# Altium footprint library TomvanRijn-PCB.PcbLib: 165 footprints (part 5 of 11)
Each footprint in its own frame and in the unit in brackets; x right, y up, seen from the top. Pads: shape width x height; smd on the part's side, far side on the other; paste and mask are expansions set on the pad; w line width, h text height; cw(c..) or ccw(c..) is an arc to the next point about the centre after c.
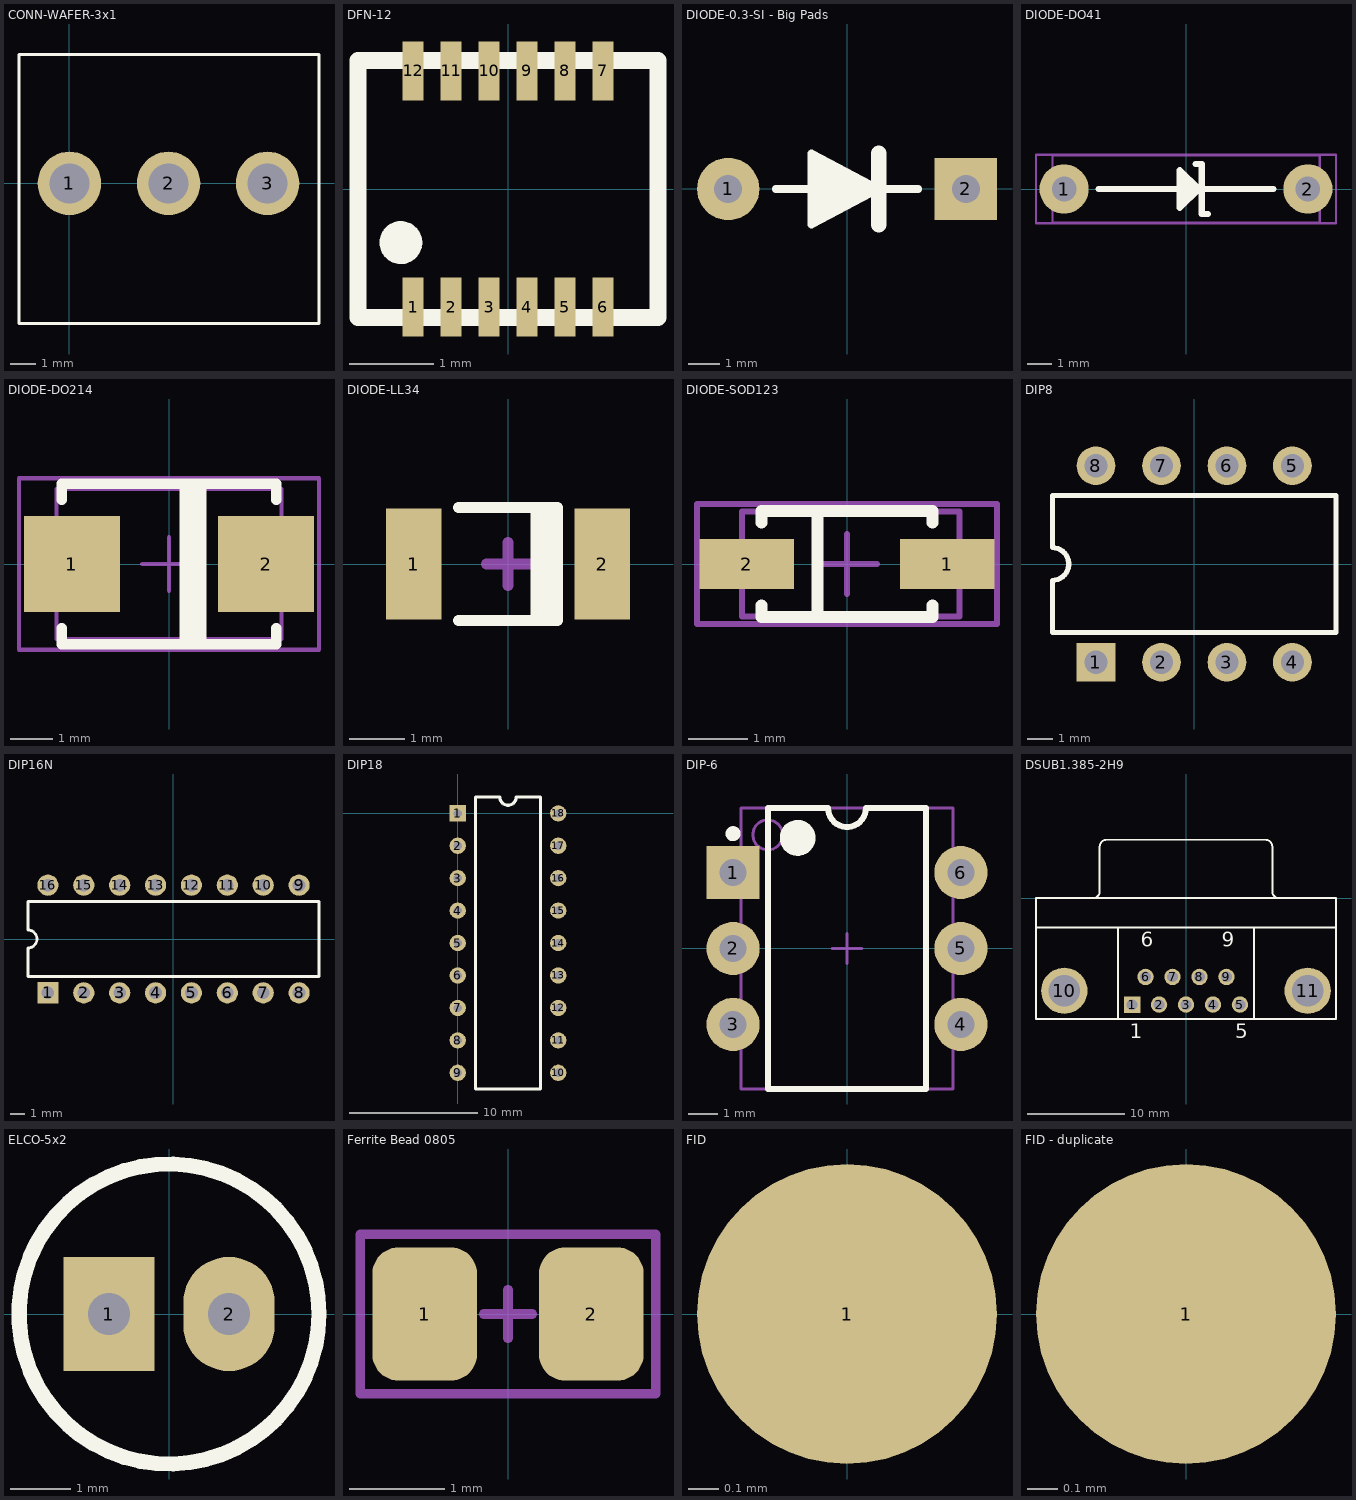
[diagram p4: the footprints below, top view; thin cyan lines are the x and y axes]

## CONN-WAFER-3x1 [mm] "Wafer Power Connector 3-pin 3.96mm pitch CH 3.96"
pads (3):
  round 2.54 hole 1.6: 1(0,0) 2(3.96,0) 3(7.92,0)
Top Overlay:
  lines w0.127: -2.02,-5.6 9.98,-5.6 9.98,5.15 -2.02,5.15 -2.02,-5.6
3D body "39-26-3030.stp": height 14.6, standoff -4.45, extent -1.6,-5.6 9.52,5.15
3D body: height 3, standoff 0, extent -2.019,-5.6 9.979,5.149

## DFN-12 [mm] "12 Lead Plastic DFN 3mm x 3mm"
height 1
pads (12):
  rect 0.25x0.7 smd: 1(-1.125,-1.4) 2(-0.675,-1.4) 3(-0.225,-1.4) 4(0.225,-1.4) 5(0.675,-1.4) 6(1.125,-1.4) 7(1.125,1.4) 8(0.675,1.4) 9(0.225,1.4) 10(-0.225,1.4) 11(-0.675,1.4) 12(-1.125,1.4)
Top Overlay:
  circle w0.254: c-1.27,-0.635 r0.127
  lines w0.203: -1.778,-1.524 -1.778,1.524 1.778,1.524 1.778,-1.524 -1.778,-1.524
3D body "User Library-FAN5354.step": height 0.75, standoff -0.05, extent -1.75,-1.505 1.75,1.505

## DIODE-0.3-SI - Big Pads [mm] "Axial Silicon Diode, Leads 0.3 inch spacing"
height 2.8
pads (2):
  round 2 hole 0.9: 1(-3.81,0)
  rect 2x2 hole 0.9: 2(3.81,0)
Top Overlay:
  region: -1.143,1.143 1.016,0 -1.143,-1.143
  lines w0.254: -2.286,0 2.286,0 ; -1.143,-1.143 -1.143,1.143 1.016,0 -1.143,-1.143
  lines w0.508: 1.016,-1.143 1.016,1.143
3D body "1N4007.step": height 3.06, standoff -1.27, extent -4.204,-1.333 4.204,1.334

## DIODE-DO41 [mm] "Diode, through hole, DO-41"
pads (2):
  round 2 hole 1: 1(-4.953,0) 2(4.953,0)
Top Overlay:
  region: -0.254,0.762 0.508,0 -0.254,-0.762
  lines w0.254: -3.556,0 3.556,0 ; 0.381,1.016 0.635,1.016 0.635,-1.016 0.889,-1.016 ; 0.508,0 -0.254,-0.762 -0.254,0.762 0.508,0 ; 0.508,0 0.635,0 0.508,0
Mechanical 13:
  lines w0.1: -5.426,-1.362 -5.426,1.363 5.434,1.363 5.434,-1.362 -5.426,-1.362
Mechanical 15:
  lines w0.1: -0.635,0 0.635,0 ; 0,-0.635 0,0.635 ; -6.096,-1.397 -6.096,1.397 6.096,1.397 6.096,-1.397 -6.096,-1.397
3D body "User Library-DO-41.step": height 2.86, standoff -2.5, extent -5.426,-1.362 5.434,1.363

## DIODE-DO214 [mil] "DO-214-AC/SMA; 2 C-Bend Leads; Body 5.3 x 2.6 mm, inc. leads (LxW)"
height 90.55
pads (2):
  rect 90x90 smd: 1(-90.55,0) 2(90.55,0)
Top Overlay:
  lines w10: -100,-60 -100,-75 100,-75 100,-60 ; -100,60 -100,75 100,75 100,60 ; 15,-75 15,75 ; 25,-75 25,75 ; 30,-70 30,75
Mechanical 13:
  lines w3.94: -105,-70 -105,70 105,70 105,-70 -105,-70
Mechanical 15:
  lines w3.94: -25,0 25,0 ; 0,-25 0,25 ; -140,-80 -140,80 140,80 140,-80 -140,-80
3D body "DO-214AA.step": height 90.75, standoff 0, extent -106.31,-70.88 106.29,70.86

## DIODE-LL34 [mm] "Diode, LL-34, 3.4 mm x 1.4 mm"
height 1.4
pads (2):
  rect 1x2 smd: 1(-1.7,0) 2(1.7,0)
Top Overlay:
  rectangle: 0.508,-1.016 0.889,1.016
  lines w0.203: -0.889,-1.016 0.889,-1.016 0.889,1.016 -0.889,1.016 ; 0.508,-1.016 0.508,1.016
Mechanical 15:
  lines w0.203: -0.381,0 0.381,0 ; 0,-0.381 0,0.381
3D body "LL-34.step": height 1.4, standoff 0, extent -1.7,-0.7 1.7,0.7

## DIODE-SOD123 [mm] "Diode; SOD-123; 2 Leads; Body 2.7 x 1.6 mm"
height 1.35
pads (2):
  rect 1.6x0.85 smd: 1(1.7,0) 2(-1.7,0)
Top Overlay:
  lines w0.2: -1.45,-0.7 -1.45,-0.9 1.45,-0.9 1.45,-0.7 ; -1.45,0.7 -1.45,0.9 1.45,0.9 1.45,0.7 ; -0.5,-0.9 -0.5,0.9
Mechanical 13:
  lines w0.1: -1.778,-0.889 -1.778,0.889 1.905,0.889 1.905,-0.889 -1.778,-0.889
Mechanical 15:
  lines w0.1: -0.508,0 0.508,0 ; 0,-0.508 0,0.508 ; -2.54,-1.016 2.54,-1.016 2.54,1.016 -2.54,1.016 -2.54,-1.016
3D body "SOD-123.step": height 1.27, standoff 0, extent -1.778,-0.8 1.922,0.8

## DIP8 [mm] "DIP; 8 Leads; Row Spacing 7.62 mm; Pitch 2.54 mm"
height 5.08
pads (8):
  rect 1.5x1.5 hole 0.9: 1(-3.81,-3.81)
  round 1.5 hole 0.9: 2(-1.27,-3.81) 3(1.27,-3.81) 4(3.81,-3.81) 5(3.81,3.81) 6(1.27,3.81) 7(-1.27,3.81) 8(-3.81,3.81)
Top Overlay:
  lines w0.2: -5.5,-2.65 -5.5,-0.635 ccw(c-5.5,0) -5.5,0.635 -5.5,2.65 5.5,2.65 5.5,-2.65 -5.5,-2.65

## DIP16N [mm] "DIP; 16 Leads; Row Spacing 7.62 mm; Pitch 2.54 mm"
height 5.1
pads (16):
  rect 1.5x1.5 hole 0.9: 1(-8.89,-3.81)
  round 1.5 hole 0.9: 2(-6.35,-3.81) 3(-3.81,-3.81) 4(-1.27,-3.81) 5(1.27,-3.81) 6(3.81,-3.81) 7(6.35,-3.81) 8(8.89,-3.81) 9(8.89,3.81) 10(6.35,3.81) 11(3.81,3.81) 12(1.27,3.81) 13(-1.27,3.81) 14(-3.81,3.81) 15(-6.35,3.81) 16(-8.89,3.81)
Top Overlay:
  lines w0.2: -10.3,-2.65 -10.3,-0.635 ccw(c-10.3,0) -10.3,0.635 -10.3,2.65 10.3,2.65 10.3,-2.65 -10.3,-2.65
3D body "User Library-DIP16-300.step": height 5.08, standoff -2.49, extent -10,-3.935 10,3.935

## DIP18 [mm]
pads (18):
  rect 1.27x1.27 hole 0.635: 1(0,0)
  round 1.27 hole 0.635: 2(0,-2.54) 3(0,-5.08) 4(0,-7.62) 5(0,-10.16) 6(0,-12.7) 7(0,-15.24) 8(0,-17.78) 9(0,-20.32) 10(7.87,-20.32) 11(7.87,-17.78) 12(7.87,-15.24) 13(7.87,-12.7) 14(7.87,-10.16) 15(7.87,-7.62) 16(7.87,-5.08) 17(7.87,-2.54) 18(7.87,0)
Top Overlay:
  lines w0.254: 1.389,-21.59 1.389,1.27 3.3,1.27 ccw(c3.935,1.27) 4.57,1.27 6.481,1.27 6.481,-21.59 1.389,-21.59
3D body "SW3dPS-DIP18-300.STEP": height 5.08, standoff -2.49, extent 0.002,-21.593 7.872,1.397

## DIP-6 [mil] "DIP; 6 Leads; Row Spacing 7.62 mm; Pitch 2.54 mm"
height 214.96
pads (6):
  rect 70x70 hole 35.43: 1(-150,100)
  round 70 hole 35.43: 2(-150,0) 3(-150,-100) 4(150,-100) 5(150,0) 6(150,100)
Top Overlay:
  circle w9.84: c-150,151.18 r4.92
  circle w23.62: c-64.96,145.67 r11.81
  lines w7.87: -104.33,-185.04 -104.33,185.04 -25,185.04 ccw(c0,185.04) 25,185.04 104.33,185.04 104.33,-185.04 -104.33,-185.04
Mechanical 13:
  circle w3.94: c-104.33,149.61 r19.68
  lines w3.94: -139.76,-185.04 -139.76,185.04 139.76,185.04 139.76,-185.04 -139.76,-185.04
Mechanical 15:
  lines w3.94: -19.68,0 19.68,0 ; 0,-19.68 0,19.68
3D body "DIP-6.step": height 224.8, standoff -125.2, extent -155.9,-175 155.91,175

## DSUB1.385-2H9 [mm] "Connector; D Subminiature; 9 Position; Right Angle; Pitch 1.385 mm"
height 12.75
pads (11):
  rect 1.69x1.69 hole 1.09: 1(-5.54,-10.92)
  round 1.69 hole 1.09: 2(-2.77,-10.92) 3(0,-10.92) 4(2.77,-10.92) 5(5.54,-10.92) 6(-4.155,-8.08) 7(-1.385,-8.08) 8(1.385,-8.08) 9(4.155,-8.08)
  round 4.76 hole 3.26: 10(-12.495,-9.5) 11(12.495,-9.5)
Top Overlay:
  lines w0.2: -15.4,-3 15.4,-3 ; -9.56,0.005 ccw(c-9.56,0.7) -8.865,0.7 -8.865,5.3 ; -8.86,5.305 cw(c-8.165,5.305) -8.165,6 8.165,6 cw(c8.165,5.305) 8.86,5.305 ; -7,-12.4 -7,-3 ; 7,-12.4 7,-3 ; 8.865,5.3 8.865,0.7 ccw(c9.56,0.7) 9.56,0.005 ; -15.4,-12.4 15.4,-12.4 15.4,0 -15.4,0 -15.4,-12.4
  text "6" at -4.655,-4.975 h1.5
  text "9" at 3.655,-4.975 h1.5
  text "5" at 5.04,-14.375 h1.5
  text "1" at -5.79,-14.375 h1.5
3D body "SW3dPS-dsub.STEP": height 12.5, standoff -4.1, extent -15.618,-12.7 15.618,7.9

## ELCO-5x2 [mm] "Capacitor, electrolytic, 5 mm diameter, 2 mm pitch"
height 6.35
pads (2):
  rect 1.524x1.905 hole 0.7: 1(-1,0)
  oval 1.524x1.905 hole 0.7: 2(1,0)
Top Overlay:
  circle w0.254: c0,0 r2.5
3D body "User Library-cap 5x11.STEP": height 11, standoff -19, extent -2.5,-2.489 2.5,2.511

## Ferrite Bead 0805 [mm] "SMD Ferrite Bead 0805"
pads (2):
  rrect50% 1.1x1.4 smd: 1(-0.875,0) 2(0.875,0)
Mechanical 15:
  lines w0.1: -0.254,0 0.254,0 ; 0,-0.254 0,0.254 ; -1.549,-0.838 1.549,-0.838 1.549,0.838 -1.549,0.838 -1.549,-0.838
3D body "User Library-FB_2012-1.STEP": height 0.85, standoff 0, extent -1,-0.625 1,0.625

## FID [mm] "Fiducial Mark, 1 mm"
pads (1):
  round 1.001 smd paste+0 mask+1.001: 1(0,0)

## FID - duplicate [mm] "Fiducial Mark, 1 mm"
pads (1):
  round 1.001 smd paste+0 mask+1.001: 1(0,0)